# Altium footprint library ATM1099C-0627-ssy-1.brd.PcbLib: 48 footprints (part 3 of 3)
Each footprint in its own frame and in the unit in brackets; x right, y up, seen from the top. Pads: shape width x height; smd on the part's side, far side on the other; paste and mask are expansions set on the pad; w line width, h text height; cw(c..) or ccw(c..) is an arc to the next point about the centre after c.
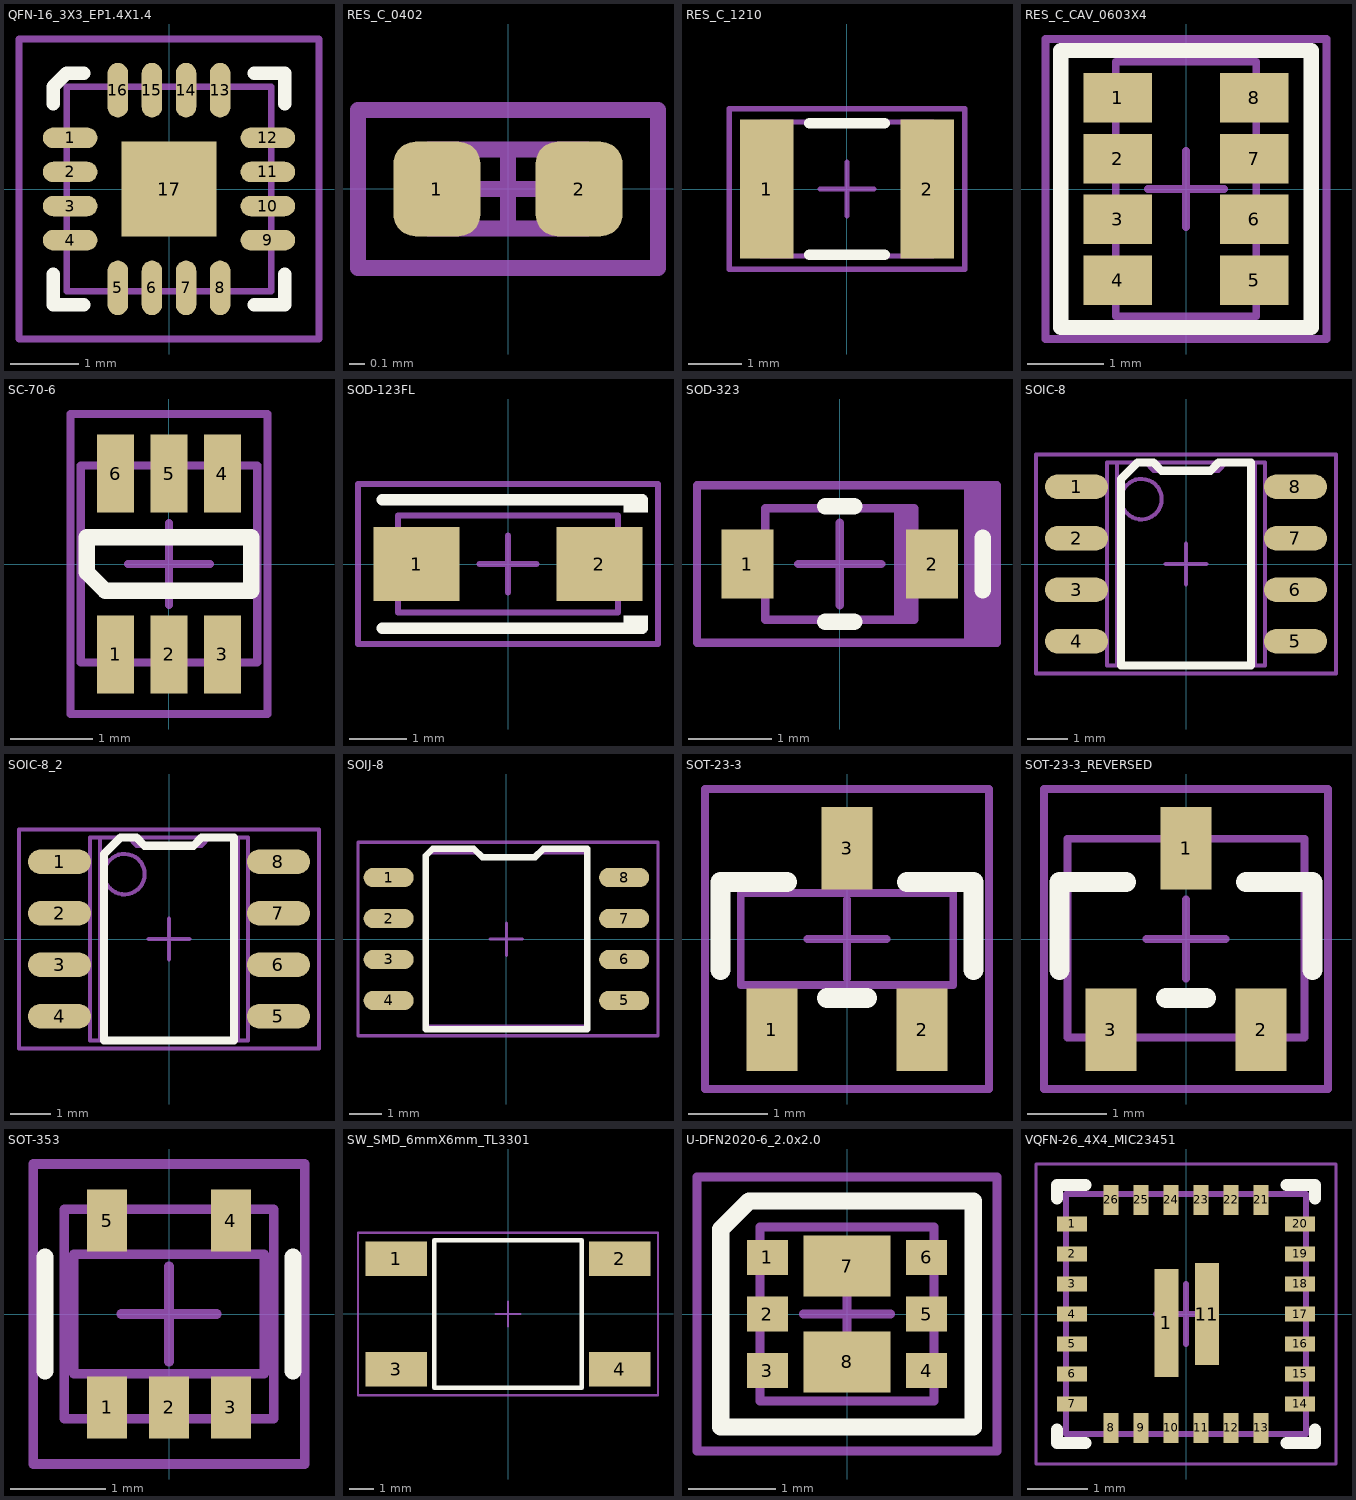
[diagram p2: the footprints below, top view; thin cyan lines are the x and y axes]

## QFN-16_3X3_EP1.4X1.4 [mm] "QFN 16 pin P=0.5mm, L=3mm, W=3mm, H=0.9mm"
height 0.9
pads (17):
  oval 0.8x0.3 smd mask+0.05: 1(-1.45,0.75) 2(-1.45,0.25) 3(-1.45,-0.25) 4(-1.45,-0.75) 9(1.45,-0.75) 10(1.45,-0.25) 11(1.45,0.25) 12(1.45,0.75)
  oval 0.3x0.8 smd mask+0.05: 5(-0.75,-1.45) 6(-0.25,-1.45) 7(0.25,-1.45) 8(0.75,-1.45) 13(0.75,1.45) 14(0.25,1.45) 15(-0.25,1.45) 16(-0.75,1.45)
  rect 1.4x1.4 smd: 17(0,0)
Top Overlay:
  lines w0.2: -1.7,-1.25 -1.7,-1.7 -1.25,-1.7 ; -1.7,1.25 -1.7,1.5 -1.5,1.7 -1.25,1.7 ; 1.25,-1.7 1.7,-1.7 1.7,-1.25 ; 1.25,1.7 1.7,1.7 1.7,1.25
  text "." at -2.3,1.6 h1
Mechanical 11:
  lines w0.1: -1.5,-1.5 -1.5,1.5 1.5,1.5 1.5,-1.5 -1.5,-1.5
  text ".Designator" at -0.275,-0.075 h0.5
  text "1" at -1.35,0.9 h0.7
Mechanical 15:
  lines w0.1: -0.5,0 0.5,0 ; 0,-0.5 0,0.5 ; -2.2,-2.2 2.2,-2.2 2.2,2.2 -2.2,2.2 -2.2,-2.2
3D body "QFN-16_3x3.step": height 0.9, standoff 0, extent -1.501,-1.501 1.501,1.501

## RES_C_0402 [mm] "Chip Resistor, 2-Leads, Body 1.0x0.5mm, IPC Medium Density"
height 0.35
pads (2):
  rrect50% 0.55x0.6 smd: 1(-0.45,0) 2(0.45,0)
Mechanical 11:
  lines w0.1: -0.5,-0.25 0.5,-0.25 0.5,0.25 -0.5,0.25 -0.5,-0.25
  text ".Designator" at -0.4,-0.15 h0.3
Mechanical 13:
  lines w0.1: -0.5,-0.25 -0.5,0.25 0.5,0.25 0.5,-0.25 -0.5,-0.25
Mechanical 15:
  lines w0.1: -0.25,0 0.25,0 ; 0,-0.25 0,0.25 ; -0.95,-0.5 -0.95,0.5 0.95,0.5 0.95,-0.5 -0.95,-0.5
3D body "RES_0402.step": height 0.2, standoff 0, extent -0.5,-0.3 0.5,0.3

## RES_C_1210 [mm] "Chip Resistor, 2-Leads, Body 3.2x2.5mm, IPC Medium Density"
height 0.6
pads (2):
  rect 1x2.6 smd: 1(-1.5,0) 2(1.5,0)
Top Overlay:
  lines w0.2: -0.7,-1.225 0.7,-1.225 ; -0.7,1.225 0.7,1.225
Mechanical 11:
  lines w0.1: -2.2,-1.5 -2.2,1.5 2.2,1.5 2.2,-1.5 -2.2,-1.5
  text ".Designator" at 1.25,0.475 h1
Mechanical 13:
  lines w0.1: -1.6,-1.25 1.6,-1.25 1.6,1.25 -1.6,1.25 -1.6,-1.25
Mechanical 15:
  lines w0.1: -0.5,0 0.5,0 ; 0,-0.5 0,0.5 ; -2.2,-1.5 2.2,-1.5 2.2,1.5 -2.2,1.5 -2.2,-1.5
3D body "RES_2010.step": height 0.57, standoff 0, extent -1.55,-1.301 1.55,1.301

## RES_C_CAV_0603X4 [mm]
height 0.7
pads (8):
  rect 0.9x0.65 smd: 1(-0.9,1.2) 2(-0.9,0.4) 3(-0.9,-0.4) 4(-0.9,-1.2) 5(0.9,-1.2) 6(0.9,-0.4) 7(0.9,0.4) 8(0.9,1.2)
Top Overlay:
  lines w0.2: -1.65,-1.825 -1.65,1.825 1.65,1.825 1.65,-1.825 -1.65,-1.825
  text "." at -2.225,1.4 h1
Mechanical 11:
  lines w0.1: -0.925,-1.675 0.925,-1.675 0.925,1.675 -0.925,1.675 -0.925,-1.675
  text ".Designator" at -0.489,-0.354 h1
  text "." at -0.625,1.225 h1
Mechanical 15:
  lines w0.1: -0.5,0 0.5,0 ; 0,-0.5 0,0.5 ; -1.85,-1.975 1.85,-1.975 1.85,1.975 -1.85,1.975 -1.85,-1.975
3D body "RES_C_CAV_1206x4x.step": height 0.7, standoff 0, extent -0.925,-1.675 0.925,1.675

## SC-70-6 [mm]
height 0.8
pads (6):
  rect 0.45x0.95 smd: 1(-0.65,-1.1) 2(0,-1.1) 3(0.65,-1.1) 4(0.65,1.1) 5(0,1.1) 6(-0.65,1.1)
Top Overlay:
  lines w0.2: -1,-0.1 -1,0.325 1,0.325 1,-0.325 -0.775,-0.325 -1,-0.1
  text "." at -1.525,-1.425 h0.8
Mechanical 11:
  lines w0.1: -1.075,-1.2 1.075,-1.2 1.075,1.2 -1.075,1.2 -1.075,-1.2
  text "1" at -0.7,-1.1 h0.5
  text ".Designator" at -0.7,-0.4 h0.75
Mechanical 15:
  lines w0.1: -0.5,0 0.5,0 ; 0,-0.5 0,0.5 ; -1.2,-1.825 -1.2,1.825 1.2,1.825 1.2,-1.825 -1.2,-1.825
3D body "User Library-SC70-6.step": height 0.92, standoff -0.03, extent -1,-1.05 1,1.05

## SOD-123FL [mm]
pads (2):
  rect 1.5x1.3 smd: 1(-1.6,0) 2(1.6,0)
Top Overlay:
  rectangle: 2.025,0.9 2.45,1.15
  rectangle: 2.025,-1.15 2.45,-0.9
  lines w0.2: -2.2,-1.125 2.35,-1.125 ; 2.35,1.125 -2.2,1.125 ; -2.2,1.125 -2.2,1.125
Mechanical 11:
  lines w0.1: -1.925,-0.85 -1.925,0.85 1.925,0.85 1.925,-0.85 -1.925,-0.85
  text "'.Designator'" at -0.625,-0.175 h0.5
Mechanical 15:
  lines w0.1: -0.5,0 0.5,0 ; 0,-0.5 0,0.5 ; -2.625,-1.4 2.625,-1.4 2.625,1.4 -2.625,1.4 -2.625,-1.4
3D body "SOD-123.step": height 1.43, standoff -0.02, extent -1.925,-0.85 1.925,0.85

## SOD-323 [mm] "Molded Diode, 2-Leads, Body 1.8x1.4mm, IPC Medium Density"
height 1.1
pads (2):
  rect 0.63x0.83 smd: 1(-1.115,0) 2(1.115,0)
Top Overlay:
  lines w0.2: -0.175,-0.7 0.175,-0.7 ; -0.175,0.7 0.175,0.7 ; 1.73,-0.315 1.73,0.315
Mechanical 11:
  rectangle: 1.5,-0.95 1.9,0.95
  lines w0.1: -1.725,-0.95 1.9,-0.95 1.9,0.95 -1.725,0.95 -1.725,-0.95
  text ".Designator" at 0.7,0.425 h0.8
Mechanical 13:
  region: 0.9,0.675 0.658,0.675 0.658,-0.675 0.9,-0.675
  lines w0.1: -0.9,-0.675 -0.9,0.675 0.9,0.675 0.9,-0.675 -0.9,-0.675
Mechanical 15:
  lines w0.1: -0.5,0 0.5,0 ; 0,-0.5 0,0.5 ; -1.725,-0.95 -1.725,0.95 1.9,0.95 1.9,-0.95 -1.725,-0.95
3D body "SOD-323.step": height 1.1, standoff 0, extent -1.3,-0.675 1.3,0.675

## SOIC-8 [mm] "SOIC, 8-Leads, Overall 4.9x6mm, Pitch 1.27mm, IPC Medium Density"
height 1.75
pads (8):
  oval 1.55x0.6 smd: 1(-2.7,1.905) 2(-2.7,0.635) 3(-2.7,-0.635) 4(-2.7,-1.905) 5(2.7,-1.905) 6(2.7,-0.635) 7(2.7,0.635) 8(2.7,1.905)
Top Overlay:
  lines w0.2: -1.6,-2.5 -1.6,2.1 -1.2,2.5 -0.8,2.5 -0.6,2.3 0.6,2.3 0.8,2.5 1.6,2.5 1.6,-2.5 -1.6,-2.5
Mechanical 11:
  lines w0.1: -1.7,-2.5 -1.7,2.5 -1,2.5 -0.8,2.3 0.8,2.3 1,2.5 1.7,2.5 1.7,-2.5 -1.7,-2.5
  text "1" at -3.1,2 h1
  text ".Designator" at -0.517,1.022 h1
Mechanical 13:
  circle w0.1: c-1.1,1.6 r0.5
  lines w0.1: -1.95,-2.5 1.95,-2.5 1.95,2.5 -1.95,2.5 -1.95,-2.5
Mechanical 15:
  lines w0.1: -0.5,0 0.5,0 ; 0,-0.5 0,0.5 ; -3.7,-2.7 3.7,-2.7 3.7,2.7 -3.7,2.7 -3.7,-2.7
3D body "SOIC-8.step": height 1.75, standoff 0, extent -3.006,-2.5 3.006,2.5

## SOIC-8_2 [mm]
pads (8):
  oval 1.55x0.6 smd: 1(-2.7,1.905) 2(-2.7,0.635) 3(-2.7,-0.635) 4(-2.7,-1.905) 5(2.7,-1.905) 6(2.7,-0.635) 7(2.7,0.635) 8(2.7,1.905)
Top Overlay:
  lines w0.2: -1.6,-2.5 1.6,-2.5 1.6,2.5 0.8,2.5 0.6,2.3 -0.6,2.3 -0.8,2.5 -1.2,2.5 -1.6,2.1 -1.6,-2.5
Mechanical 11:
  lines w0.1: -1.7,-2.5 1.7,-2.5 1.7,2.5 1,2.5 0.8,2.3 -0.8,2.3 -1,2.5 -1.7,2.5 -1.7,-2.5
  text ".Designator" at -0.515,1.171 h1
  text "1" at -3.1,2 h1
Mechanical 13:
  circle w0.1: c-1.1,1.6 r0.5
  lines w0.1: -1.95,-2.5 -1.95,2.5 1.95,2.5 1.95,-2.5 -1.95,-2.5
Mechanical 15:
  lines w0.1: -0.5,0 0.5,0 ; 0,-0.5 0,0.5 ; -3.7,-2.7 -3.7,2.7 3.7,2.7 3.7,-2.7 -3.7,-2.7
3D body "SOIC-8.step": height 1.75, standoff 0, extent -3.006,-2.5 3.006,2.5

## SOIJ-8 [mm] "SOIC, 8-Leads, Overall 4.9x6mm, Pitch 1.27mm, IPC Medium Density"
height 1.75
pads (8):
  oval 1.55x0.6 smd: 1(-3.65,1.905) 2(-3.65,0.635) 3(-3.65,-0.635) 4(-3.65,-1.905) 5(3.65,-1.905) 6(3.65,-0.635) 7(3.65,0.635) 8(3.65,1.905)
Top Overlay:
  lines w0.2: -2.5,-2.8 -2.5,2.58 -2.28,2.8 -1.008,2.8 -0.748,2.54 0.889,2.54 1.149,2.8 2.5,2.8 2.5,-2.8 -2.5,-2.8
  text "." at -3.8,2.7 h1
Mechanical 11:
  lines w0.1: -2.5,-2.7 -2.5,2.58 -2.413,2.667 -0.929,2.667 -0.762,2.5 0.849,2.5 1.016,2.667 2.5,2.667 2.5,-2.7 -2.5,-2.7
  text "1" at -3.429,1.905 h0.5
  text ".Designator" at -0.536,0.864 h1
Mechanical 15:
  lines w0.1: -0.508,0 0.492,0 ; 0,-0.508 0,0.492 ; -4.6,-3 4.7,-3 4.7,3 -4.6,3 -4.6,-3
3D body "SOIC-8_Wide.step": height 1.75, standoff -0.01, extent -4.051,-2.73 4.05,2.73

## SOT-23-3 [mm]
pads (3):
  rect 0.65x1.05 smd: 1(-0.95,-1.15) 2(0.95,-1.15) 3(0,1.15)
Top Overlay:
  lines w0.254: -1.6,-0.394 -1.6,0.722 -0.762,0.722 ; -0.254,-0.748 0.254,-0.748 ; 0.762,0.722 1.6,0.722 1.6,-0.394
Mechanical 11:
  lines w0.1: -1.13,-0.584 -1.13,-1.168 -0.775,-1.168 -0.775,-0.584 ; -0.175,0.584 -0.175,1.168 0.18,1.168 0.18,0.584 ; 0.77,-0.584 0.77,-1.168 1.125,-1.168 1.125,-0.584 ; -1.346,-0.584 1.346,-0.584 1.346,0.584 -1.346,0.584 -1.346,-0.584
  text ".Designator" at -0.8,-0.5 h0.8
Mechanical 15:
  lines w0.1: -0.5,0 0.5,0 ; 0,-0.5 0,0.5 ; -1.8,-1.9 1.8,-1.9 1.8,1.9 -1.8,1.9 -1.8,-1.9
3D body "SOT-23.step": height 1.09, standoff -0.01, extent -1.5,-1.25 1.5,1.25

## SOT-23-3_REVERSED [mm]
pads (3):
  rect 0.65x1.05 smd: 1(0,1.15) 2(0.95,-1.15) 3(-0.95,-1.15)
Top Overlay:
  lines w0.254: -1.6,-0.394 -1.6,0.722 -0.762,0.722 ; -0.254,-0.748 0.254,-0.748 ; 0.762,0.722 1.6,0.722 1.6,-0.394
Mechanical 11:
  lines w0.1: -1.5,-1.25 1.5,-1.25 1.5,1.27 -1.5,1.27 -1.5,-1.25
  text ".Designator" at 0.725,0.55 h1
Mechanical 15:
  lines w0.1: -0.5,0 0.5,0 ; 0,-0.5 0,0.5 ; -1.8,-1.9 1.8,-1.9 1.8,1.9 -1.8,1.9 -1.8,-1.9
3D body "SOT-23.step": height 1.09, standoff -0.01, extent -1.5,-1.25 1.5,1.25

## SOT-353 [mm]
pads (5):
  rect 0.42x0.65 smd paste+0: 1(-0.65,-0.98)
  rect 0.42x0.65 smd: 2(0,-0.98) 3(0.65,-0.98) 4(0.65,0.98) 5(-0.65,0.98)
Top Overlay:
  lines w0.178: -1.3,-0.6 -1.3,0.6 ; 1.3,-0.6 1.3,0.6
  text "." at -1.315,-1.788 h1
Mechanical 11:
  lines w0.1: -1.1,-1.1 1.1,-1.1 1.1,1.1 -1.1,1.1 -1.1,-1.1
  text "1" at -0.9,-0.975 h1.2
  text ".Designator" at -0.44,-0.313 h1
Mechanical 13:
  lines w0.1: -1,-0.625 -1,0.625 1,0.625 1,-0.625 -1,-0.625
Mechanical 15:
  lines w0.1: -0.5,0 0.5,0 ; 0,-0.5 0,0.5 ; -1.425,-1.575 -1.425,1.575 1.425,1.575 1.425,-1.575 -1.425,-1.575
3D body "User Library-SOT353-1.STEP": height 1.1, standoff 0, extent -1.1,-1.2 1.1,1.2

## SW_SMD_6mmX6mm_TL3301 [mm]
pads (4):
  rect 2.5x1.4 smd: 1(-4.55,2.25) 2(4.55,2.25) 3(-4.55,-2.25) 4(4.55,-2.25)
Top Overlay:
  lines w0.2: -3,-3 -3,3 3,3 3,-3 -3,-3
Mechanical 11:
  lines w0.1: -6.1,-3.3 -6.1,3.3 6.1,3.3 6.1,-3.3 -6.1,-3.3
  text ".designator" at 0.89,0.47 h1
Mechanical 15:
  lines w0.1: -0.5,0 0.5,0 ; 0,-0.5 0,0.5 ; -6.1,-3.3 6.1,-3.3 6.1,3.3 -6.1,3.3 -6.1,-3.3
3D body "TL3301AFxxxxG.stp": height 5.12, standoff 0.02, extent -5,-3 5,3

## U-DFN2020-6_2.0x2.0 [mm]
height 1
pads (8):
  rect 0.47x0.4 smd mask+0.05: 1(-0.915,0.65) 2(-0.915,0) 3(-0.915,-0.65) 4(0.915,-0.65) 5(0.915,0) 6(0.915,0.65)
  rect 1x0.7 smd: 7(0,0.55) 8(0,-0.55)
Top Overlay:
  lines w0.2: -1.45,-1.3 -1.45,0.975 -1.125,1.3 1.45,1.3 1.45,-1.3 -1.45,-1.3
  text "." at -2.025,0.85 h0.8
Mechanical 11:
  lines w0.1: -1,-1 1,-1 1,1 -1,1 -1,-1
  text ".Designator" at -0.225,-0.2 h0.5
  text "1" at -0.85,0.75 h0.5
Mechanical 15:
  lines w0.1: -0.5,0 0.5,0 ; 0,-0.5 0,0.5 ; -1.725,-1.575 -1.725,1.575 1.725,1.575 1.725,-1.575 -1.725,-1.575
3D body: height 0.13, standoff 0, extent 1,0.5 1.05,0.8
3D body: height 0.13, standoff 0, extent 1,-0.15 1.05,0.15
3D body: height 0.13, standoff 0, extent 1,-0.8 1.05,-0.5
3D body: height 0.13, standoff 0, extent -1.05,-0.8 -1,-0.5
3D body: height 0.13, standoff 0, extent -1.05,-0.15 -1,0.15
3D body: height 0.05, standoff 0, extent 0.725,-0.15 1,0.15
3D body: height 0.05, standoff 0, extent 0.725,0.5 1,0.8
3D body: height 0.05, standoff 0, extent 0.725,-0.8 1,-0.5
3D body: height 0.05, standoff 0, extent -1,-0.8 -0.725,-0.5
3D body: height 0.05, standoff 0, extent -1,-0.15 -0.725,0.15
3D body: height 0.55, standoff 0.05, extent -1,-1 1,1
3D body: height 0.05, standoff 0, extent -1,0.5 -0.725,0.8
3D body: height 0.13, standoff 0, extent -1.05,0.5 -1,0.8
3D body: height 0.05, standoff 0, extent -0.4,-0.8 0.4,0.8

## VQFN-26_4X4_MIC23451 [mm]
height 0.9
pads (28):
  rect 0.5x0.25 smd mask+0.075: 1(-1.9,1.5) 2(-1.9,1) 3(-1.9,0.5) 4(-1.9,0) 5(-1.9,-0.5) 6(-1.9,-1) 7(-1.9,-1.5) 14(1.9,-1.5) 15(1.9,-1) 16(1.9,-0.5) 17(1.9,0) 18(1.9,0.5) 19(1.9,1) 20(1.9,1.5)
  rect 0.4x1.8 smd mask+0.075: 1(-0.325,-0.15)
  rect 0.25x0.5 smd mask+0.075: 8(-1.25,-1.9) 9(-0.75,-1.9) 10(-0.25,-1.9) 11(0.25,-1.9) 12(0.75,-1.9) 13(1.25,-1.9) 21(1.25,1.9) 22(0.75,1.9) 23(0.25,1.9) 24(-0.25,1.9) 25(-0.75,1.9) 26(-1.25,1.9)
  rect 0.4x1.7 smd mask+0.075: 11(0.35,0)
Top Overlay:
  lines w0.2: -2.15,-1.925 -2.15,-2.15 -1.675,-2.15 ; -2.15,1.925 -2.15,2.15 -1.675,2.15 ; 1.675,-2.15 2.15,-2.15 2.15,-1.925 ; 1.675,2.15 2.15,2.15 2.15,1.925
  text "." at -2.61,1.4 h1
Mechanical 11:
  lines w0.1: -2,-2 -2,2 2,2 2,-2 -2,-2
  text "1" at -1.9,1.6 h0.5
  text "'.Designator'" at -0.575,-0.125 h0.5
Mechanical 15:
  lines w0.05: -2.5,-2.5 -2.5,2.5 2.5,2.5 2.5,-2.5 -2.5,-2.5
  lines w0.1: -0.5,0 0.5,0 ; 0,-0.5 0,0.5
3D body "QFN50P400X400X90-26N.step": height 0.9, standoff 0, extent -2.05,-2.05 2.05,2.05